# Altium footprint library Connectors THD.PcbLib: 631 footprints (part 32 of 46)
Each footprint in its own frame and in the unit in brackets; x right, y up, seen from the top. Pads: shape width x height; smd on the part's side, far side on the other; paste and mask are expansions set on the pad; w line width, h text height; cw(c..) or ccw(c..) is an arc to the next point about the centre after c.
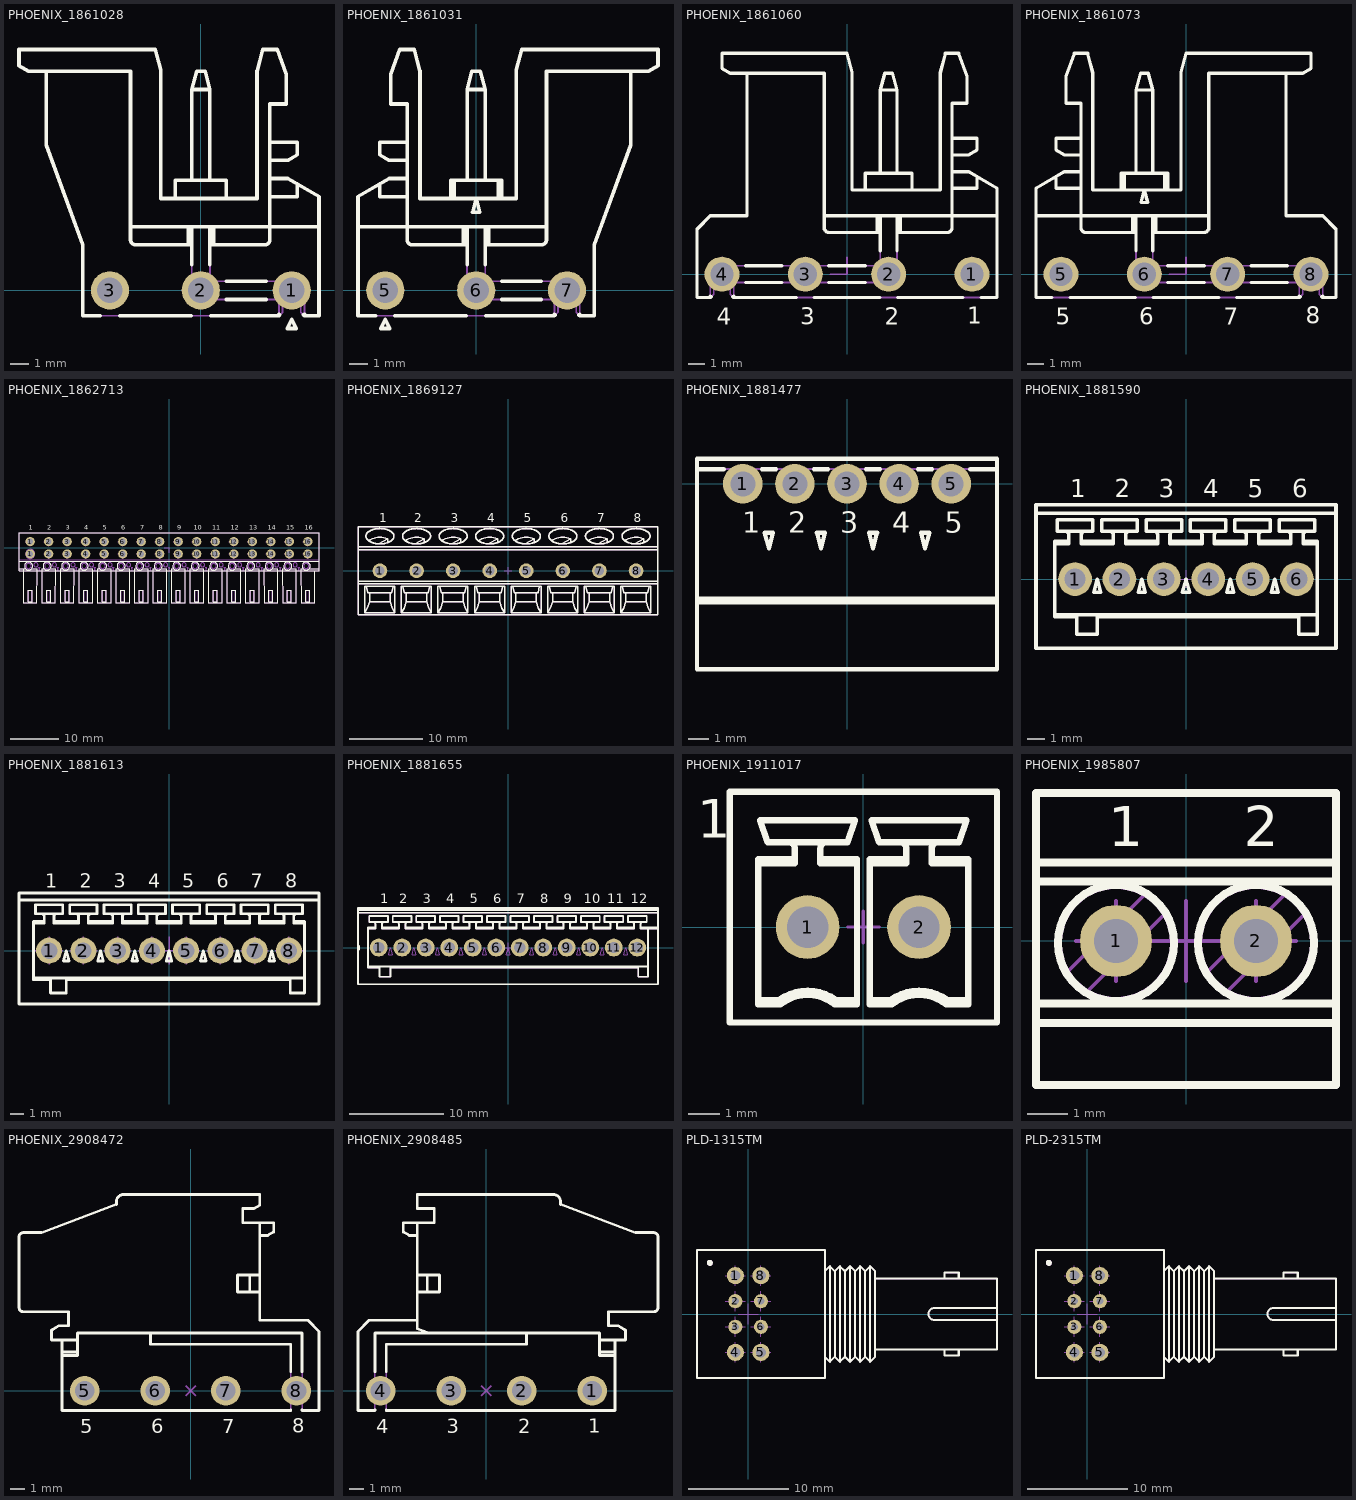
[diagram p31: the footprints below, top view; thin cyan lines are the x and y axes]

## PHOENIX_1861028 [mm] "COMBICON PCB Male Header, Pitch 5mm, 3 Positions, Left"
height 11
pads (3):
  round 2.1 hole 1.4: 1(5,0) 2(0,0) 3(-5,0)
Top Overlay:
  lines w0.2: -8.5,12.05 -8.5,7.995 -6.5,2.5 -6.5,-1.4 -5.539,-1.4 ; -4.461,-1.4 -0.539,-1.4 ; -3.87,3.5 6.5,3.5 ; -1.4,5.05 -1.4,6.05 1.4,6.05 1.4,5.05 ; -0.7,3.5 -0.7,2.5 -0.5,2.7 ; -0.5,1.414 -0.5,3.5 ; -0.5,2.5 -3.57,2.5 cw(c-3.57,2.8) -3.87,2.8 -3.87,12.05 -9.48,12.05 -10,12.35 -10,13.25 -2.5,13.25 -2.2,12.13 -2.2,5.05 3.093,5.05 3.093,12.087 3.405,13.25 4.2,13.25 4.7,11.876 4.7,10.25 3.8,10.25 3.8,2.8 cw(c3.5,2.8) 3.5,2.5 0.5,2.5 ; -0.5,6.05 -0.5,11.05 ; 0.5,1.414 0.5,3.5 ; 0.5,2.7 0.7,2.5 0.7,3.5 ; 0.5,6.05 0.5,11.05 ; 0.539,-1.4 4.3,-1.4 ; 1.414,-0.5 3.586,-0.5 ; 1.414,0.5 3.586,0.5 ; 3.8,5.15 5.3,5.15 5.3,5.85 ; 3.8,6.15 4.78,6.15 6.5,5.157 6.5,-1.4 5.7,-1.4 ; 3.8,7.15 4.78,7.15 5.3,7.45 5.3,8.15 3.8,8.15 ; 4.3,-1.327 4.3,-1.4 ; 4.349,-1.351 4.3,-1.4 ; 5.651,-1.351 5.7,-1.4 ; 5.7,-1.327 5.7,-1.4 ; -0.5,11.05 -0.232,12.05 0.232,12.05 0.5,11.05 ; -0.5,11.05 0.5,11.05 ; 4.75,-2.1 5,-1.6 5.25,-2.1 4.75,-2.1
Mechanical 8:
  lines w0.1: -6,0 -5,0 -5,1 ; -1,0 0,0 0,1 ; 4,0 5,0 5,1
Mechanical 14:
  lines w0.1: -8.5,12.05 -8.5,7.995 -6.5,2.5 -6.5,-1.4 4.3,-1.4 ; -3.87,3.5 6.5,3.5 ; -1.4,5.05 -1.4,6.05 1.4,6.05 1.4,5.05 ; -0.7,3.5 -0.7,2.5 -0.5,2.7 ; -0.5,2.5 -3.57,2.5 cw(c-3.57,2.8) -3.87,2.8 -3.87,12.05 -9.48,12.05 -10,12.35 -10,13.25 -2.5,13.25 -2.2,12.13 -2.2,5.05 3.093,5.05 3.093,12.087 3.405,13.25 4.2,13.25 4.7,11.876 4.7,10.25 3.8,10.25 3.8,2.8 cw(c3.5,2.8) 3.5,2.5 0.5,2.5 ; -0.5,3.5 -0.5,0.7 ccw(c0.7,0.7) 0.7,-0.5 5.5,-0.5 ; -0.5,6.05 -0.5,11.05 ; 0.5,2.7 0.7,2.5 0.7,3.5 ; 0.5,3.5 0.5,0.7 ccw(c0.7,0.7) 0.7,0.5 5.5,0.5 ; 0.5,6.05 0.5,11.05 ; 3.8,5.15 5.3,5.15 5.3,5.85 ; 3.8,6.15 4.78,6.15 6.5,5.157 6.5,-1.4 5.7,-1.4 ; 3.8,7.15 4.78,7.15 5.3,7.45 5.3,8.15 3.8,8.15 ; 4.5,-0.5 4.5,-1.2 4.3,-1.4 ; 4.5,0.5 4.3,0.7 ; -0.5,11.05 -0.232,12.05 0.232,12.05 0.5,11.05 ; -0.5,11.05 0.5,11.05 ; 4.3,-1.4 4.3,0.7 ; 4.3,0.7 5.7,0.7 ; 5.5,0.5 5.7,0.7 ; 5.5,0.5 5.5,-1.2 5.7,-1.4 ; 5.7,-1.4 5.7,0.7
3D body: height 10.97, standoff -3.98, extent -10,-1.4 6.5,13.25

## PHOENIX_1861031 [mm] "COMBICON PCB Male Header, Pitch 5mm, 3 Positions, Right"
height 11
pads (3):
  round 2.1 hole 1.4: 5(-5,0) 6(0,0) 7(5,0)
Top Overlay:
  lines w0.2: -6.5,3.5 3.87,3.5 ; -5.539,-1.4 -6.5,-1.4 -6.5,5.157 -4.78,6.15 -3.8,6.15 ; -5.3,5.85 -5.3,5.15 -3.8,5.15 ; -4.461,-1.4 -0.539,-1.4 ; -3.8,7.15 -4.78,7.15 -5.3,7.45 -5.3,8.15 -3.8,8.15 ; -1.4,5.05 -1.4,6.05 1.4,6.05 1.4,5.05 ; -1.212,5.05 -1.212,6.05 ; -0.7,3.5 -0.7,2.5 -0.5,2.7 ; -0.5,1.414 -0.5,3.5 ; -0.5,2.5 -3.5,2.5 cw(c-3.5,2.8) -3.8,2.8 -3.8,10.25 -4.7,10.25 -4.7,11.876 -4.2,13.25 -3.405,13.25 -3.093,12.087 -3.093,5.05 2.2,5.05 2.2,12.13 2.5,13.25 10,13.25 10,12.35 9.48,12.05 3.87,12.05 3.87,2.8 cw(c3.57,2.8) 3.57,2.5 0.5,2.5 ; -0.5,6.05 -0.5,11.05 ; 0.5,1.414 0.5,3.5 ; 0.5,2.7 0.7,2.5 0.7,3.5 ; 0.5,6.05 0.5,11.05 ; 0.539,-1.4 4.3,-1.4 ; 1.212,5.05 1.212,6.05 ; 1.414,-0.5 3.586,-0.5 ; 1.414,0.5 3.586,0.5 ; 4.3,-1.327 4.3,-1.4 ; 4.349,-1.351 4.3,-1.4 ; 5.651,-1.351 5.7,-1.4 ; 5.7,-1.327 5.7,-1.4 ; 8.5,12.05 8.5,7.995 6.5,2.5 6.5,-1.4 5.7,-1.4 ; -0.5,11.05 -0.232,12.05 0.232,12.05 0.5,11.05 ; -0.5,11.05 0.5,11.05 ; -5.25,-2.1 -5,-1.6 -4.75,-2.1 -5.25,-2.1 ; -0.201,4.3 0,5.05 0.201,4.3 -0.201,4.3
Mechanical 8:
  lines w0.1: -5,-1 -5,0 -4,0 ; 0,-1 0,0 1,0 ; 5,-1 5,0 6,0
Mechanical 14:
  lines w0.1: -6.5,3.5 3.87,3.5 ; -5.3,5.85 -5.3,5.15 -3.8,5.15 ; -3.8,6.15 -4.78,6.15 -6.5,5.157 -6.5,-1.4 4.3,-1.4 ; -3.8,7.15 -4.78,7.15 -5.3,7.45 -5.3,8.15 -3.8,8.15 ; -1.4,5.05 -1.4,6.05 1.4,6.05 1.4,5.05 ; -1.212,5.05 -1.212,6.05 ; -0.7,3.5 -0.7,2.5 -0.5,2.7 ; -0.5,2.5 -3.5,2.5 cw(c-3.5,2.8) -3.8,2.8 -3.8,10.25 -4.7,10.25 -4.7,11.876 -4.2,13.25 -3.405,13.25 -3.093,12.087 -3.093,5.05 2.2,5.05 2.2,12.13 2.5,13.25 10,13.25 10,12.35 9.48,12.05 3.87,12.05 3.87,2.8 cw(c3.57,2.8) 3.57,2.5 0.5,2.5 ; -0.5,3.5 -0.5,0.7 ccw(c0.7,0.7) 0.7,-0.5 5.5,-0.5 ; -0.5,6.05 -0.5,11.05 ; 0.5,2.7 0.7,2.5 0.7,3.5 ; 0.5,3.5 0.5,0.7 ccw(c0.7,0.7) 0.7,0.5 5.5,0.5 ; 0.5,6.05 0.5,11.05 ; 1.212,5.05 1.212,6.05 ; 4.5,-0.5 4.5,-1.2 4.3,-1.4 ; 4.5,0.5 4.3,0.7 ; 8.5,12.05 8.5,7.995 6.5,2.5 6.5,-1.4 5.7,-1.4 ; -0.5,11.05 -0.232,12.05 0.232,12.05 0.5,11.05 ; -0.5,11.05 0.5,11.05 ; 4.3,-1.4 4.3,0.7 ; 4.3,0.7 5.7,0.7 ; 5.5,0.5 5.7,0.7 ; 5.5,0.5 5.5,-1.2 5.7,-1.4 ; 5.7,-1.4 5.7,0.7 ; -0.201,4.3 0,5.05 0.201,4.3 -0.201,4.3
3D body: height 10.97, standoff -3.98, extent -6.5,-1.4 10,13.25

## PHOENIX_1861060 [mm] "COMBICON PCB Male Header, Pitch 5mm, 4 Positions, Left"
height 16
pads (4):
  round 2.1 hole 1.4: 1(7.5,0) 2(2.5,0) 3(-2.5,0) 4(-7.5,0)
Top Overlay:
  lines w0.2: -8.2,-1.327 -8.2,-1.4 ; -8.151,-1.351 -8.2,-1.4 ; -6.849,-1.351 -6.8,-1.4 ; -6.8,-1.327 -6.8,-1.4 ; -6.086,-0.5 -3.914,-0.5 ; -6.086,0.5 -3.914,0.5 ; -6,12.05 -6,3.5 -8.2,3.5 -9,2.7 -9,-1.4 -8.2,-1.4 ; -3.039,-1.4 -6.8,-1.4 ; -1.961,-1.4 1.961,-1.4 ; -1.37,3.5 9,3.5 ; -1.086,-0.5 1.086,-0.5 ; -1.086,0.5 1.086,0.5 ; 1.1,5.05 1.1,6.05 3.9,6.05 3.9,5.05 ; 1.8,3.5 1.8,2.5 2,2.7 ; 2,1.414 2,3.5 ; 2,2.5 -1.07,2.5 cw(c-1.07,2.8) -1.37,2.8 -1.37,12.05 -6.98,12.05 -7.5,12.35 -7.5,13.25 0,13.25 0.3,12.13 0.3,5.05 5.593,5.05 5.593,12.087 5.905,13.25 6.7,13.25 7.2,11.876 7.2,10.25 6.3,10.25 6.3,2.8 cw(c6,2.8) 6,2.5 3,2.5 ; 2,6.05 2,11.05 ; 3,1.414 3,3.5 ; 3,2.7 3.2,2.5 3.2,3.5 ; 3,6.05 3,11.05 ; 3.039,-1.4 6.961,-1.4 ; 6.3,5.15 7.8,5.15 7.8,5.85 ; 6.3,6.15 7.28,6.15 9,5.157 9,-1.4 8.039,-1.4 ; 6.3,7.15 7.28,7.15 7.8,7.45 7.8,8.15 6.3,8.15 ; 2,11.05 2.268,12.05 2.732,12.05 3,11.05 ; 2,11.05 3,11.05
  text "1" at 7.2,-2.972 h1
  text "4" at -7.825,-3.025 h1
  text "3" at -2.8,-3.025 h1
  text "2" at 2.25,-3.025 h1
Mechanical 8:
  lines w0.1: -8.5,0 -7.5,0 -7.5,1 ; -3.5,0 -2.5,0 -2.5,1 ; -1,0 0,0 0,1 ; 1.5,0 2.5,0 2.5,1 ; 6.5,0 7.5,0 7.5,1
Mechanical 14:
  lines w0.1: -8,-0.5 1.8,-0.5 ccw(c1.8,0.7) 3,0.7 3,3.5 ; -7,-0.5 -7,-1.2 -6.8,-1.4 ; -7,0.5 -6.8,0.7 ; -6.8,-0.5 -6.8,-1.4 ; -6.8,0.5 -6.8,0.7 ; -6,12.05 -6,3.5 -8.2,3.5 -9,2.7 -9,-1.4 -8.2,-1.4 ; -1.37,3.5 9,3.5 ; 1.1,5.05 1.1,6.05 3.9,6.05 3.9,5.05 ; 1.8,3.5 1.8,2.5 2,2.7 ; 2,2.5 -1.07,2.5 cw(c-1.07,2.8) -1.37,2.8 -1.37,12.05 -6.98,12.05 -7.5,12.35 -7.5,13.25 0,13.25 0.3,12.13 0.3,5.05 5.593,5.05 5.593,12.087 5.905,13.25 6.7,13.25 7.2,11.876 7.2,10.25 6.3,10.25 6.3,2.8 cw(c6,2.8) 6,2.5 3,2.5 ; 2,3.5 2,0.7 cw(c1.8,0.7) 1.8,0.5 -8,0.5 ; 2,6.05 2,11.05 ; 3,2.7 3.2,2.5 3.2,3.5 ; 3,6.05 3,11.05 ; 6.3,5.15 7.8,5.15 7.8,5.85 ; 6.3,6.15 7.28,6.15 9,5.157 9,-1.4 -6.8,-1.4 ; 6.3,7.15 7.28,7.15 7.8,7.45 7.8,8.15 6.3,8.15 ; -8.2,-1.4 -8.2,0.7 ; -8.2,-1.4 -8,-1.2 -8,0.5 ; -8.2,0.7 -8,0.5 ; -8.2,0.7 -6.8,0.7 ; 2,11.05 2.268,12.05 2.732,12.05 3,11.05 ; 2,11.05 3,11.05
  text "2" at 2.25,-3.025 h1
  text "3" at -2.8,-3.025 h1
  text "4" at -7.825,-3.025 h1
  text "1" at 7.2,-2.972 h1
3D body: height 15.97, standoff -3.98, extent -9,-1.4 9,13.25

## PHOENIX_1861073 [mm] "COMBICON PCB Male Header, Pitch 5mm, 4 Positions, Right"
height 16
pads (4):
  round 2.1 hole 1.4: 5(-7.5,0) 6(-2.5,0) 7(2.5,0) 8(7.5,0)
Top Overlay:
  lines w0.2: -9,3.5 1.37,3.5 ; -8.039,-1.4 -9,-1.4 -9,5.157 -7.28,6.15 -6.3,6.15 ; -7.8,5.85 -7.8,5.15 -6.3,5.15 ; -6.961,-1.4 -3.039,-1.4 ; -6.3,7.15 -7.28,7.15 -7.8,7.45 -7.8,8.15 -6.3,8.15 ; -3.9,5.05 -3.9,6.05 -1.1,6.05 -1.1,5.05 ; -3.712,5.05 -3.712,6.05 ; -3.2,3.5 -3.2,2.5 -3,2.7 ; -3,1.414 -3,3.5 ; -3,2.5 -6,2.5 cw(c-6,2.8) -6.3,2.8 -6.3,10.25 -7.2,10.25 -7.2,11.876 -6.7,13.25 -5.905,13.25 -5.593,12.087 -5.593,5.05 -0.3,5.05 -0.3,12.13 0,13.25 7.5,13.25 7.5,12.35 6.98,12.05 1.37,12.05 1.37,2.8 cw(c1.07,2.8) 1.07,2.5 -2,2.5 ; -3,6.05 -3,11.05 ; -2,1.414 -2,3.5 ; -2,2.7 -1.8,2.5 -1.8,3.5 ; -2,6.05 -2,11.05 ; -1.961,-1.4 1.961,-1.4 ; -1.288,5.05 -1.288,6.05 ; -1.086,-0.5 1.086,-0.5 ; -1.086,0.5 1.086,0.5 ; 3.039,-1.4 6.8,-1.4 ; 3.914,-0.5 6.086,-0.5 ; 3.914,0.5 6.086,0.5 ; 6,12.05 6,3.5 8.2,3.5 9,2.7 9,-1.4 8.2,-1.4 ; 6.8,-1.327 6.8,-1.4 ; 6.849,-1.351 6.8,-1.4 ; 8.151,-1.351 8.2,-1.4 ; 8.2,-1.327 8.2,-1.4 ; -3,11.05 -2,11.05 ; -3,11.05 -2.732,12.05 -2.268,12.05 -2,11.05 ; -2.701,4.3 -2.299,4.3 -2.5,5.05 -2.701,4.3
  text "8" at 7.2,-2.972 h1
  text "5" at -7.825,-3.025 h1
  text "6" at -2.8,-3.025 h1
  text "7" at 2.25,-3.025 h1
Mechanical 8:
  lines w0.1: -8.5,0 -7.5,0 -7.5,-1 ; -3.5,0 -2.5,0 -2.5,-1 ; -1,0 0,0 0,1 ; 1.5,0 2.5,0 2.5,-1 ; 6.5,0 7.5,0 7.5,-1
Mechanical 14:
  lines w0.1: -9,3.5 1.37,3.5 ; -7.8,5.85 -7.8,5.15 -6.3,5.15 ; -6.3,6.15 -7.28,6.15 -9,5.157 -9,-1.4 6.8,-1.4 ; -6.3,7.15 -7.28,7.15 -7.8,7.45 -7.8,8.15 -6.3,8.15 ; -3.9,5.05 -3.9,6.05 -1.1,6.05 -1.1,5.05 ; -3.712,5.05 -3.712,6.05 ; -3.2,3.5 -3.2,2.5 -3,2.7 ; -3,2.5 -6,2.5 cw(c-6,2.8) -6.3,2.8 -6.3,10.25 -7.2,10.25 -7.2,11.876 -6.7,13.25 -5.905,13.25 -5.593,12.087 -5.593,5.05 -0.3,5.05 -0.3,12.13 0,13.25 7.5,13.25 7.5,12.35 6.98,12.05 1.37,12.05 1.37,2.8 cw(c1.07,2.8) 1.07,2.5 -2,2.5 ; -3,3.5 -3,0.7 ccw(c-1.8,0.7) -1.8,-0.5 8,-0.5 ; -3,6.05 -3,11.05 ; -2,2.7 -1.8,2.5 -1.8,3.5 ; -2,3.5 -2,0.7 ccw(c-1.8,0.7) -1.8,0.5 8,0.5 ; -2,6.05 -2,11.05 ; -1.288,5.05 -1.288,6.05 ; 6,12.05 6,3.5 8.2,3.5 9,2.7 9,-1.4 8.2,-1.4 ; 6.8,-0.5 6.8,-1.4 ; 6.8,0.5 6.8,0.7 ; 7,-0.5 7,-1.2 6.8,-1.4 ; 7,0.5 6.8,0.7 ; -3,11.05 -2,11.05 ; -3,11.05 -2.732,12.05 -2.268,12.05 -2,11.05 ; 6.8,0.7 8.2,0.7 ; 8,0.5 8.2,0.7 ; 8,0.5 8,-1.2 8.2,-1.4 ; 8.2,-1.4 8.2,0.7 ; -2.701,4.3 -2.299,4.3 -2.5,5.05 -2.701,4.3
  text "7" at 2.25,-3.025 h1
  text "6" at -2.8,-3.025 h1
  text "5" at -7.825,-3.025 h1
  text "8" at 7.2,-2.972 h1
3D body: height 15.97, standoff -3.98, extent -9,-1.4 9,13.25

## PHOENIX_1862713 [mm] "PHOENIX IMC Series, Pitch 3.81mm, 8A, 160V, 16 Positions Header"
height 6.85
pads (32):
  round 1.9 hole 1.2: 1(-28.575,-1.27) 1(-28.575,1.27) 2(-24.765,-1.27) 2(-24.765,1.27) 3(-20.955,-1.27) 3(-20.955,1.27) 4(-17.145,-1.27) 4(-17.145,1.27) 5(-13.335,-1.27) 5(-13.335,1.27) 6(-9.525,-1.27) 6(-9.525,1.27) 7(-5.715,-1.27) 7(-5.715,1.27) 8(-1.905,-1.27) 8(-1.905,1.27) 9(1.905,-1.27) 9(1.905,1.27) 10(5.715,-1.27) 10(5.715,1.27) 11(9.525,-1.27) 11(9.525,1.27) 12(13.335,-1.27) 12(13.335,1.27) 13(17.145,-1.27) 13(17.145,1.27) 14(20.955,-1.27) 14(20.955,1.27) 15(24.765,-1.27) 15(24.765,1.27) 16(28.575,-1.27) 16(28.575,1.27)
Top Overlay:
  drawing of 165 lines, arcs and shapes, not listed
  text "12" at 12.7,3.683 h1
  text "11" at 8.89,3.683 h1
  text "3" at -21.209,3.683 h1
  text "2" at -25.019,3.683 h1
  text "1" at -28.829,3.683 h1
  text "4" at -17.399,3.683 h1
  text "7" at -5.969,3.683 h1
  text "6" at -9.779,3.683 h1
  text "5" at -13.589,3.683 h1
  text "8" at -2.159,3.683 h1
  text "9" at 1.651,3.683 h1
  text "10" at 5.08,3.683 h1
  text "13" at 16.51,3.683 h1
  text "14" at 20.32,3.683 h1
  text "15" at 24.13,3.683 h1
  text "16" at 27.94,3.683 h1
Mechanical 8:
  circle w0.1: c-28.575,-1.27 r0.6
  circle w0.1: c-28.575,-1.27 r0.95
  lines w0.1: -29.575,-1.27 -28.575,-1.27 -28.575,-2.27 ; -29.575,1.27 -28.575,1.27 -28.575,0.27 ; -25.765,-1.27 -24.765,-1.27 -24.765,-2.27 ; -25.765,1.27 -24.765,1.27 -24.765,0.27 ; -21.955,-1.27 -20.955,-1.27 -20.955,-2.27 ; -21.955,1.27 -20.955,1.27 -20.955,0.27 ; -18.145,-1.27 -17.145,-1.27 -17.145,-2.27 ; -18.145,1.27 -17.145,1.27 -17.145,0.27 ; -14.335,-1.27 -13.335,-1.27 -13.335,-2.27 ; -14.335,1.27 -13.335,1.27 -13.335,0.27 ; -10.525,-1.27 -9.525,-1.27 -9.525,-2.27 ; -10.525,1.27 -9.525,1.27 -9.525,0.27 ; -6.715,-1.27 -5.715,-1.27 -5.715,-2.27 ; -6.715,1.27 -5.715,1.27 -5.715,0.27 ; -2.905,-1.27 -1.905,-1.27 -1.905,-2.27 ; -2.905,1.27 -1.905,1.27 -1.905,0.27 ; -1,0 0,0 0,-1 ; 0.905,-1.27 1.905,-1.27 1.905,-2.27 ; 0.905,1.27 1.905,1.27 1.905,0.27 ; 4.715,-1.27 5.715,-1.27 5.715,-2.27 ; 4.715,1.27 5.715,1.27 5.715,0.27 ; 8.525,-1.27 9.525,-1.27 9.525,-2.27 ; 8.525,1.27 9.525,1.27 9.525,0.27 ; 12.335,-1.27 13.335,-1.27 13.335,-2.27 ; 12.335,1.27 13.335,1.27 13.335,0.27 ; 16.145,-1.27 17.145,-1.27 17.145,-2.27 ; 16.145,1.27 17.145,1.27 17.145,0.27 ; 19.955,-1.27 20.955,-1.27 20.955,-2.27 ; 19.955,1.27 20.955,1.27 20.955,0.27 ; 23.765,-1.27 24.765,-1.27 24.765,-2.27 ; 23.765,1.27 24.765,1.27 24.765,0.27 ; 27.575,-1.27 28.575,-1.27 28.575,-2.27 ; 27.575,1.27 28.575,1.27 28.575,0.27
Mechanical 14:
  drawing of 274 lines, arcs and shapes, not listed
3D body: height 6.85, standoff -3.4, extent -30.875,-11.37 30.875,3.13

## PHOENIX_1869127 [mm] "PC Terminal Block, Pitch 5mm, 8 Positions, Screw Connection"
height 11
pads (8):
  round 2 hole 1.3: 1(-17.5,0) 2(-12.5,0) 3(-7.5,0) 4(-2.5,0) 5(2.5,0) 6(7.5,0) 7(12.5,0) 8(17.5,0)
Top Overlay:
  drawing of 1168 lines, arcs and shapes, not listed
  text "1" at -17.619,6.65 h1.2
  text "2" at -12.833,6.65 h1.2
  text "3" at -7.833,6.65 h1.2
  text "4" at -2.857,6.65 h1.2
  text "5" at 2.167,6.65 h1.2
  text "6" at 7.19,6.65 h1.2
  text "7" at 12.167,6.65 h1.2
  text "8" at 17.167,6.65 h1.2
Mechanical 8:
  lines w0.1: -18,0 -17.5,0 ; -17.5,-0.5 -17.5,0 ; -17.5,0.5 -17.5,0 ; -17,0 -17.5,0 ; -13,0 -12.5,0 ; -12.5,-0.5 -12.5,0 ; -12.5,0.5 -12.5,0 ; -12,0 -12.5,0 ; -8,0 -7.5,0 ; -7.5,-0.5 -7.5,0 ; -7.5,0.5 -7.5,0 ; -7,0 -7.5,0 ; -3,0 -2.5,0 ; -2.5,-0.5 -2.5,0 ; -2.5,0.5 -2.5,0 ; -2,0 -2.5,0 ; -0.5,0 0,0 ; 0,-0.5 0,0 ; 0,0.5 0,0 ; 0.5,0 0,0 ; 2,0 2.5,0 ; 2.5,-0.5 2.5,0 ; 2.5,0.5 2.5,0 ; 3,0 2.5,0 ; 7,0 7.5,0 ; 7.5,-0.5 7.5,0 ; 7.5,0.5 7.5,0 ; 8,0 7.5,0 ; 12,0 12.5,0 ; 12.5,-0.5 12.5,0 ; 12.5,0.5 12.5,0 ; 13,0 12.5,0 ; 17,0 17.5,0 ; 17.5,-0.5 17.5,0 ; 17.5,0.5 17.5,0 ; 18,0 17.5,0
Mechanical 14:
  drawing of 1168 lines, arcs and shapes, not listed
  text "8" at 17.167,6.65 h1.2
  text "7" at 12.167,6.65 h1.2
  text "6" at 7.19,6.65 h1.2
  text "5" at 2.167,6.65 h1.2
  text "4" at -2.857,6.65 h1.2
  text "3" at -7.833,6.65 h1.2
  text "2" at -12.833,6.65 h1.2
  text "1" at -17.619,6.65 h1.2
3D body: height 11, standoff -3.5, extent -20.5,-6 20.5,6

## PHOENIX_1881477 [mm] "PHOENIX MC Serie, Pitch 2.5mm, 4A, 80V, 5 Positions Header"
height 8.1
pads (5):
  round 1.9 hole 1.2: 1(-5,0) 2(-2.5,0) 3(0,0) 4(2.5,0) 5(5,0)
Top Overlay:
  lines w0.2: -7.2,-5.7 7.2,-5.7 ; -7.2,-5.5 7.2,-5.5 ; -7.2,0.7 -5.912,0.7 ; -4.088,0.7 -3.412,0.7 ; -1.588,0.7 -0.912,0.7 ; 0.912,0.7 1.588,0.7 ; 3.412,0.7 4.088,0.7 ; 5.912,0.7 7.2,0.7 ; -7.2,-8.9 -7.2,1.2 7.2,1.2 7.2,-8.9 -7.2,-8.9 ; -3.951,-2.35 -3.549,-2.35 -3.75,-3.1 -3.951,-2.35 ; -1.451,-2.35 -1.049,-2.35 -1.25,-3.1 -1.451,-2.35 ; 1.049,-2.35 1.451,-2.35 1.25,-3.1 1.049,-2.35 ; 3.549,-2.35 3.951,-2.35 3.75,-3.1 3.549,-2.35
  text "1" at -5.017,-2.35 h1
  text "2" at -2.817,-2.35 h1
  text "3" at -0.317,-2.35 h1
  text "4" at 2.183,-2.35 h1
  text "5" at 4.683,-2.35 h1
Mechanical 8:
  lines w0.1: -5.5,0 -5,0 ; -5,-0.5 -5,0 ; -5,0.5 -5,0 ; -4.5,0 -5,0 ; -3,0 -2.5,0 ; -2.5,-0.5 -2.5,0 ; -2.5,0.5 -2.5,0 ; -2,0 -2.5,0 ; -0.5,0 0,0 ; 0,-0.5 0,0 ; 0,0.5 0,0 ; 0.5,0 0,0 ; 2,0 2.5,0 ; 2.5,-0.5 2.5,0 ; 2.5,0.5 2.5,0 ; 3,0 2.5,0 ; 4.5,0 5,0 ; 5,-0.5 5,0 ; 5,0.5 5,0 ; 5.5,0 5,0
Mechanical 14:
  lines w0.1: -7.2,-5.7 7.2,-5.7 ; -7.2,-5.5 7.2,-5.5 ; -7.2,0.7 7.2,0.7 ; -7.2,-8.9 -7.2,1.2 7.2,1.2 7.2,-8.9 -7.2,-8.9 ; -3.951,-2.35 -3.549,-2.35 -3.75,-3.1 -3.951,-2.35 ; -1.451,-2.35 -1.049,-2.35 -1.25,-3.1 -1.451,-2.35 ; 1.049,-2.35 1.451,-2.35 1.25,-3.1 1.049,-2.35 ; 3.549,-2.35 3.951,-2.35 3.75,-3.1 3.549,-2.35
3D body: height 8.1, standoff -3.5, extent -7.2,-8.9 7.2,1.2

## PHOENIX_1881590 [mm] "PHOENIX MCV Serie, Pitch 2.5mm, 4A, 160V, 6 Positions Header"
height 10.1
pads (6):
  round 1.9 hole 1.2: 1(-6.25,0) 2(-3.75,0) 3(-1.25,0) 4(1.25,0) 5(3.75,0) 6(6.25,0)
Top Overlay:
  lines w0.2: -8.45,3.7 8.45,3.7 ; -7.4,-2 7.4,-2 ; -7.4,2 -6.6,2 -6.6,2.5 ccw(c-6.8,2.5) -6.8,2.7 ; -6.6,2.134 -7.4,2.134 -7.4,-2.134 -6.15,-2.134 ; -6.15,-2 -6.15,-3.1 -5,-3.1 -5,-2 ; -5.9,2.134 -4.1,2.134 ; -5.7,2.7 ccw(c-5.7,2.5) -5.9,2.5 -5.9,2 -4.1,2 -4.1,2.5 ccw(c-4.3,2.5) -4.3,2.7 ; -5,-2.134 6.35,-2.134 ; -3.4,2.134 -1.6,2.134 ; -3.2,2.7 ccw(c-3.2,2.5) -3.4,2.5 -3.4,2 -1.6,2 -1.6,2.5 ccw(c-1.8,2.5) -1.8,2.7 ; -0.9,2.134 0.9,2.134 ; -0.7,2.7 ccw(c-0.7,2.5) -0.9,2.5 -0.9,2 0.9,2 0.9,2.5 ccw(c0.7,2.5) 0.7,2.7 ; 1.6,2.134 3.4,2.134 ; 1.8,2.7 ccw(c1.8,2.5) 1.6,2.5 1.6,2 3.4,2 3.4,2.5 ccw(c3.2,2.5) 3.2,2.7 ; 4.1,2.134 5.9,2.134 ; 4.3,2.7 ccw(c4.3,2.5) 4.1,2.5 4.1,2 5.9,2 5.9,2.5 ccw(c5.7,2.5) 5.7,2.7 ; 6.35,-2 6.35,-3.1 7.4,-3.1 7.4,2.134 6.6,2.134 ; 6.8,2.7 ccw(c6.8,2.5) 6.6,2.5 6.6,2 7.4,2 ; -8.45,-3.9 8.45,-3.9 8.45,4.2 -8.45,4.2 -8.45,-3.9 ; -7.25,2.7 -5.25,2.7 -5.25,3.35 -7.25,3.35 -7.25,2.7 ; -5.201,-0.75 -4.799,-0.75 -5,0 -5.201,-0.75 ; -4.75,2.7 -2.75,2.7 -2.75,3.35 -4.75,3.35 -4.75,2.7 ; -2.701,-0.75 -2.299,-0.75 -2.5,0 -2.701,-0.75 ; -2.25,2.7 -0.25,2.7 -0.25,3.35 -2.25,3.35 -2.25,2.7 ; -0.201,-0.75 0.201,-0.75 0,0 -0.201,-0.75 ; 0.25,2.7 2.25,2.7 2.25,3.35 0.25,3.35 0.25,2.7 ; 2.299,-0.75 2.701,-0.75 2.5,0 2.299,-0.75 ; 2.75,2.7 4.75,2.7 4.75,3.35 2.75,3.35 2.75,2.7 ; 4.799,-0.75 5.201,-0.75 5,0 4.799,-0.75 ; 5.25,2.7 7.25,2.7 7.25,3.35 5.25,3.35 5.25,2.7
  text "6" at 5.975,4.6 h1
  text "4" at 0.975,4.6 h1
  text "1" at -6.525,4.6 h1
  text "2" at -4.025,4.6 h1
  text "3" at -1.525,4.6 h1
  text "5" at 3.475,4.6 h1
Mechanical 8:
  lines w0.05: -6.75,0 -6.25,0 ; -6.25,-0.5 -6.25,0 ; -6.25,0.5 -6.25,0 ; -5.75,0 -6.25,0 ; -4.25,0 -3.75,0 ; -3.75,-0.5 -3.75,0 ; -3.75,0.5 -3.75,0 ; -3.25,0 -3.75,0 ; -1.75,0 -1.25,0 ; -1.25,-0.5 -1.25,0 ; -1.25,0.5 -1.25,0 ; -0.75,0 -1.25,0 ; -0.5,0 0,0 ; 0,-0.5 0,0 ; 0,0.5 0,0 ; 0.5,0 0,0 ; 0.75,0 1.25,0 ; 1.25,-0.5 1.25,0 ; 1.25,0.5 1.25,0 ; 1.75,0 1.25,0 ; 3.25,0 3.75,0 ; 3.75,-0.5 3.75,0 ; 3.75,0.5 3.75,0 ; 4.25,0 3.75,0 ; 5.75,0 6.25,0 ; 6.25,-0.5 6.25,0 ; 6.25,0.5 6.25,0 ; 6.75,0 6.25,0
Mechanical 14:
  lines w0.1: -8.45,3.7 8.45,3.7 ; -7.4,-2 7.4,-2 ; -7.4,2 -6.6,2 -6.6,2.5 ccw(c-6.8,2.5) -6.8,2.7 ; -6.6,2.134 -7.4,2.134 -7.4,-2.134 -6.15,-2.134 ; -6.15,-2 -6.15,-3.1 -5,-3.1 -5,-2 ; -5.9,2.134 -4.1,2.134 ; -5.7,2.7 ccw(c-5.7,2.5) -5.9,2.5 -5.9,2 -4.1,2 -4.1,2.5 ccw(c-4.3,2.5) -4.3,2.7 ; -5,-2.134 6.35,-2.134 ; -3.4,2.134 -1.6,2.134 ; -3.2,2.7 ccw(c-3.2,2.5) -3.4,2.5 -3.4,2 -1.6,2 -1.6,2.5 ccw(c-1.8,2.5) -1.8,2.7 ; -0.9,2.134 0.9,2.134 ; -0.7,2.7 ccw(c-0.7,2.5) -0.9,2.5 -0.9,2 0.9,2 0.9,2.5 ccw(c0.7,2.5) 0.7,2.7 ; 1.6,2.134 3.4,2.134 ; 1.8,2.7 ccw(c1.8,2.5) 1.6,2.5 1.6,2 3.4,2 3.4,2.5 ccw(c3.2,2.5) 3.2,2.7 ; 4.1,2.134 5.9,2.134 ; 4.3,2.7 ccw(c4.3,2.5) 4.1,2.5 4.1,2 5.9,2 5.9,2.5 ccw(c5.7,2.5) 5.7,2.7 ; 6.35,-2 6.35,-3.1 7.4,-3.1 7.4,2.134 6.6,2.134 ; 6.8,2.7 ccw(c6.8,2.5) 6.6,2.5 6.6,2 7.4,2 ; -8.45,-3.9 8.45,-3.9 8.45,4.2 -8.45,4.2 -8.45,-3.9 ; -7.25,2.7 -5.25,2.7 -5.25,3.35 -7.25,3.35 -7.25,2.7 ; -5.201,-0.75 -4.799,-0.75 -5,0 -5.201,-0.75 ; -4.75,2.7 -2.75,2.7 -2.75,3.35 -4.75,3.35 -4.75,2.7 ; -2.701,-0.75 -2.299,-0.75 -2.5,0 -2.701,-0.75 ; -2.25,2.7 -0.25,2.7 -0.25,3.35 -2.25,3.35 -2.25,2.7 ; -0.201,-0.75 0.201,-0.75 0,0 -0.201,-0.75 ; 0.25,2.7 2.25,2.7 2.25,3.35 0.25,3.35 0.25,2.7 ; 2.299,-0.75 2.701,-0.75 2.5,0 2.299,-0.75 ; 2.75,2.7 4.75,2.7 4.75,3.35 2.75,3.35 2.75,2.7 ; 4.799,-0.75 5.201,-0.75 5,0 4.799,-0.75 ; 5.25,2.7 7.25,2.7 7.25,3.35 5.25,3.35 5.25,2.7